# Altium footprint library shkb_lib.PcbLib: 44 footprints (part 3 of 3)
Each footprint in its own frame and in the unit in brackets; x right, y up, seen from the top. Pads: shape width x height; smd on the part's side, far side on the other; paste and mask are expansions set on the pad; w line width, h text height; cw(c..) or ccw(c..) is an arc to the next point about the centre after c.
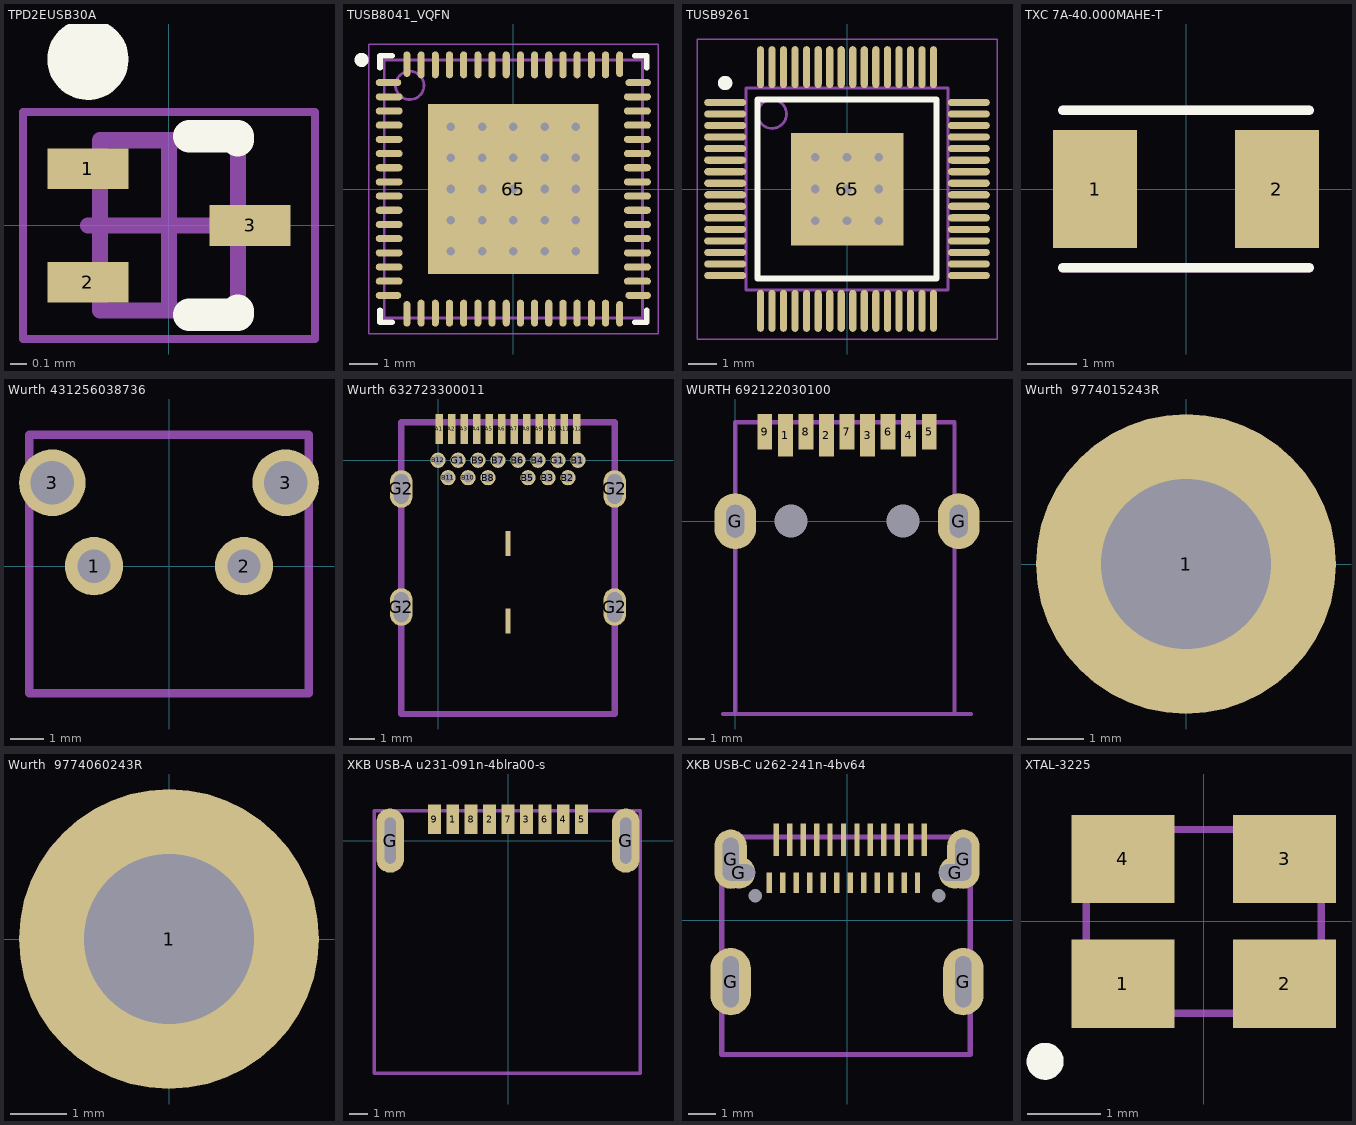
[diagram p2: the footprints below, top view; thin cyan lines are the x and y axes]

## TPD2EUSB30A [mm] "SOTFL, 3-Leads, Body 1.00x1.00mm, Pitch 0.35mm, IPC Medium Density"
height 0.5
pads (3):
  rect 0.5x0.25 smd: 1(-0.5,0.35) 2(-0.5,-0.35) 3(0.5,0)
Top Overlay:
  circle w0.25: c-0.5,1.025 r0.125
  lines w0.2: 0.125,-0.55 0.425,-0.55 0.425,-0.525 ; 0.125,0.55 0.425,0.55 0.425,0.525
Mechanical 13:
  lines w0.1: -0.425,-0.525 0.425,-0.525 0.425,0.525 -0.425,0.525 -0.425,-0.525
  text ".Designator" at -0.1,0.425 h0.2
Mechanical 15:
  lines w0.05: -0.9,-0.7 0.9,-0.7 0.9,0.7 -0.9,0.7 -0.9,-0.7
  lines w0.1: -0.5,0 0.5,0 ; 0,-0.5 0,0.5
3D body: height 0.5, standoff 0, extent -0.425,-0.525 0.425,0.525

## TUSB8041_VQFN [mm]
height 1
pads (65):
  oval 0.9x0.25 smd: 1(-4.4,3.75) 16(-4.4,-3.75) 33(4.4,-3.75) 48(4.4,3.75)
  oval 0.95x0.25 smd: 2(-4.375,3.25) 3(-4.375,2.75) 4(-4.375,2.25) 5(-4.375,1.75) 6(-4.375,1.25) 7(-4.375,0.75) 8(-4.375,0.25) 9(-4.375,-0.25) 10(-4.375,-0.75) 11(-4.375,-1.25) 12(-4.375,-1.75) 13(-4.375,-2.25) 14(-4.375,-2.75) 15(-4.375,-3.25) 34(4.375,-3.25) 35(4.375,-2.75) 36(4.375,-2.25) 37(4.375,-1.75) 38(4.375,-1.25) 39(4.375,-0.75) 40(4.375,-0.25) 41(4.375,0.25) 42(4.375,0.75) 43(4.375,1.25) 44(4.375,1.75) 45(4.375,2.25) 46(4.375,2.75) 47(4.375,3.25)
  oval 0.25x0.9 smd: 17(-3.75,-4.4) 32(3.75,-4.4) 49(3.75,4.4) 64(-3.75,4.4)
  oval 0.25x0.95 smd: 18(-3.25,-4.375) 19(-2.75,-4.375) 20(-2.25,-4.375) 21(-1.75,-4.375) 22(-1.25,-4.375) 23(-0.75,-4.375) 24(-0.25,-4.375) 25(0.25,-4.375) 26(0.75,-4.375) 27(1.25,-4.375) 28(1.75,-4.375) 29(2.25,-4.375) 30(2.75,-4.375) 31(3.25,-4.375) 50(3.25,4.375) 51(2.75,4.375) 52(2.25,4.375) 53(1.75,4.375) 54(1.25,4.375) 55(0.75,4.375) 56(0.25,4.375) 57(-0.25,4.375) 58(-0.75,4.375) 59(-1.25,4.375) 60(-1.75,4.375) 61(-2.25,4.375) 62(-2.75,4.375) 63(-3.25,4.375)
  rect 6x6 smd paste-1000: 65(0,0)
via 2.2,-2.2 diameter 0.508 hole 0.3
via 1.1,-2.2 diameter 0.508 hole 0.3
via 0,-2.2 diameter 0.508 hole 0.3
via -1.1,-2.2 diameter 0.508 hole 0.3
via -2.2,-2.2 diameter 0.508 hole 0.3
via 2.2,-1.1 diameter 0.508 hole 0.3
via 1.1,-1.1 diameter 0.508 hole 0.3
via 0,-1.1 diameter 0.508 hole 0.3
via -1.1,-1.1 diameter 0.508 hole 0.3
via -2.2,-1.1 diameter 0.508 hole 0.3
via 2.2,0 diameter 0.508 hole 0.3
via 1.1,0 diameter 0.508 hole 0.3
via 0,0 diameter 0.508 hole 0.3
via -1.1,0 diameter 0.508 hole 0.3
via -2.2,0 diameter 0.508 hole 0.3
via 2.2,1.1 diameter 0.508 hole 0.3
via 1.1,1.1 diameter 0.508 hole 0.3
via 0,1.1 diameter 0.508 hole 0.3
via -1.1,1.1 diameter 0.508 hole 0.3
via -2.2,1.1 diameter 0.508 hole 0.3
via 2.2,2.2 diameter 0.508 hole 0.3
via 1.1,2.2 diameter 0.508 hole 0.3
via 0,2.2 diameter 0.508 hole 0.3
via -1.1,2.2 diameter 0.508 hole 0.3
via -2.2,2.2 diameter 0.508 hole 0.3
Top Overlay:
  circle w0.25: c-5.35,4.55 r0.125
  lines w0.2: -4.7,-4.275 -4.7,-4.7 -4.275,-4.7 ; -4.7,4.275 -4.7,4.7 -4.275,4.7 ; 4.275,-4.7 4.7,-4.7 4.7,-4.275 ; 4.275,4.7 4.7,4.7 4.7,4.275
Top Paste:
  rectangle: -2.878,-2.878 -1.354,-1.354
  region: 2.878,-2.878 2.878,-1.354 1.354,-1.354 1.354,-2.878
  region: -2.878,2.878 -2.878,1.354 -1.354,1.354 -1.354,2.878
  region: 2.878,2.878 1.354,2.878 1.354,1.354 2.878,1.354
  rectangle: -2.878,-0.838 -1.354,0.846
  region: -0.838,2.878 -0.838,1.354 0.846,1.354 0.846,2.878
  region: 0.838,-2.878 0.838,-1.354 -0.846,-1.354 -0.846,-2.878
  region: 2.878,0.838 1.354,0.838 1.354,-0.846 2.878,-0.846
  region: 0.838,0.838 -0.846,0.838 -0.846,-0.846 0.838,-0.846
Mechanical 13:
  circle w0.1: c-3.65,3.65 r0.5
  lines w0.1: -4.55,-4.55 4.55,-4.55 4.55,4.55 -4.55,4.55 -4.55,-4.55
  text ".Designator" at -1.245,-0.787 h0.5
Mechanical 15:
  lines w0.05: -5.1,-5.1 5.1,-5.1 5.1,5.1 -5.1,5.1 -5.1,-5.1
  lines w0.1: -0.5,0 0.5,0 ; 0,-0.5 0,0.5
3D body "QFN127P600-8N.step": height 1, standoff 0, extent -4.6,-4.6 4.6,4.6

## TUSB9261 [mm]
height 1.2
pads (65):
  oval 1.45x0.25 smd: 1(-4.225,3) 2(-4.225,2.6) 3(-4.225,2.2) 4(-4.225,1.8) 5(-4.225,1.4) 6(-4.225,1) 7(-4.225,0.6) 8(-4.225,0.2) 9(-4.225,-0.2) 10(-4.225,-0.6) 11(-4.225,-1) 12(-4.225,-1.4) 13(-4.225,-1.8) 14(-4.225,-2.2) 15(-4.225,-2.6) 16(-4.225,-3) 33(4.225,-3) 34(4.225,-2.6) 35(4.225,-2.2) 36(4.225,-1.8) 37(4.225,-1.4) 38(4.225,-1) 39(4.225,-0.6) 40(4.225,-0.2) 41(4.225,0.2) 42(4.225,0.6) 43(4.225,1) 44(4.225,1.4) 45(4.225,1.8) 46(4.225,2.2) 47(4.225,2.6) 48(4.225,3)
  oval 0.25x1.45 smd: 17(-3,-4.225) 18(-2.6,-4.225) 19(-2.2,-4.225) 20(-1.8,-4.225) 21(-1.4,-4.225) 22(-1,-4.225) 23(-0.6,-4.225) 24(-0.2,-4.225) 25(0.2,-4.225) 26(0.6,-4.225) 27(1,-4.225) 28(1.4,-4.225) 29(1.8,-4.225) 30(2.2,-4.225) 31(2.6,-4.225) 32(3,-4.225) 49(3,4.225) 50(2.6,4.225) 51(2.2,4.225) 52(1.8,4.225) 53(1.4,4.225) 54(1,4.225) 55(0.6,4.225) 56(0.2,4.225) 57(-0.2,4.225) 58(-0.6,4.225) 59(-1,4.225) 60(-1.4,4.225) 61(-1.8,4.225) 62(-2.2,4.225) 63(-2.6,4.225) 64(-3,4.225)
  rect 3.9x3.9 smd: 65(0,0)
via -1.1,1.1 diameter 0.75 hole 0.3
via 0,1.1 diameter 0.75 hole 0.3
via 1.1,1.1 diameter 0.75 hole 0.3
via -1.1,0 diameter 0.75 hole 0.3
via 0,0 diameter 0.75 hole 0.3
via 1.1,0 diameter 0.75 hole 0.3
via -1.1,-1.1 diameter 0.75 hole 0.3
via 0,-1.1 diameter 0.75 hole 0.3
via 1.1,-1.1 diameter 0.75 hole 0.3
Top Overlay:
  circle w0.25: c-4.225,3.675 r0.125
  lines w0.2: -3.1,-3.1 -3.1,3.1 3.1,3.1 3.1,-3.1 -3.1,-3.1
Mechanical 13:
  circle w0.1: c-2.6,2.6 r0.5
  lines w0.1: -3.5,-3.5 -3.5,3.5 3.5,3.5 3.5,-3.5 -3.5,-3.5
Mechanical 15:
  lines w0.05: -5.2,-5.2 -5.2,5.2 5.2,5.2 5.2,-5.2 -5.2,-5.2
  lines w0.1: -0.5,0 0.5,0 ; 0,-0.5 0,0.5
3D body "TUSB9261.step": height 1.2, standoff 0, extent -4.5,-4.5 4.5,4.5

## TXC 7A-40.000MAHE-T [mm]
pads (2):
  rect 1.7x2.4 smd: 1(-1.85,0) 2(1.85,0)
Top Overlay:
  lines w0.2: -2.5,-1.6 2.5,-1.6 ; -2.5,1.6 2.5,1.6
Mechanical 13:
  lines w0.2: -2.5,-1.6 2.5,-1.6 ; -2.5,1.6 2.5,1.6
3D body: height 1.2, standoff 0, extent -2.591,-1.626 2.565,1.626

## Wurth 431256038736 [mm]
pads (4):
  round 1.75 hole 1: 1(-2.25,0) 2(2.25,0)
  round 2 hole 1.3: 3(-3.5,2.5) 3(3.5,2.5)
Mechanical 13:
  lines w0.254: -4.191,-3.81 4.191,-3.81 4.191,3.937 -4.191,3.937 -4.191,-3.81
  text ".Designator" at 2.286,-1.651 h0.5
3D body "STEP-431256038736-rev1.stp": height 7.2, standoff -3.5, extent -4.2,-3.85 4.2,4

## Wurth 632723300011 [mm]
pads (32):
  rect 0.3x1.2 smd: A1(0.05,1.25) A2(0.55,1.25) A3(1.05,1.25)
  rect 0.3x1.2 smd mask+0.102: A4(1.55,1.25) A5(2.05,1.25) A6(2.55,1.25) A7(3.05,1.25) A8(3.55,1.25) A9(4.05,1.25) A10(4.55,1.25) A11(5.05,1.25) A12(5.55,1.25)
  round 0.61 hole 0.4: B1(5.6,0) B2(5.2,-0.7) B3(4.4,-0.7) B4(4,0) B5(3.6,-0.7) B6(3.2,0) B7(2.4,0) B8(2,-0.7) B9(1.6,0) B10(1.2,-0.7) B11(0.4,-0.7) B12(0,0) G1(0.8,0) G1(4.8,0)
  oval 0.9x1.5 / inner oval 0.9x1.5 / far side oval 1.2x1.7 hole 0.6 slot 1.2 at 90 deg: G2(-1.47,-5.88) G2(7.07,-5.88)
  oval 0.9x1.5 hole 0.6 slot 1.2 at 90 deg: G2(-1.47,-1.15) G2(7.07,-1.15)
  rect 0.2x1 smd mask+0.102: G3(2.8,-6.43) G3(2.8,-3.33)
Mechanical 13:
  lines w0.254: -1.47,-10.16 7.07,-10.16 7.07,1.524 -1.47,1.524 -1.47,-10.16
  text ".Designator" at 0.152,-5.105 h0.5
3D body "STEP-632723300011-rev1.stp": height 3.09, standoff -1.77, extent -1.576,-10.286 7.164,1.508

## WURTH 692122030100 [mm]
height 6.86
pads (13):
  rect 0.9x2.6 smd: 1(3.05,5.22) 2(5.55,5.22) 3(8.05,5.22) 4(10.55,5.22)
  rect 0.9x2.15 smd: 5(11.8,5.445) 6(9.3,5.445) 7(6.8,5.445) 8(4.3,5.445) 9(1.8,5.445)
  oval 2.52x3.4 hole 1.1 slot 2 at 90 deg: G(0,0) G(13.6,0)
  round 0 hole 2 unplated paste-1 mask-1: G(3.4,0) ""(10.2,0)
Mechanical 13:
  lines w0.254: -0.75,-11.735 14.35,-11.735 ; 0,-11.716 0,5.969 ; 0,6.02 13.335,6.02 13.35,6.005 13.35,-11.716
  text ".Designator" at 4.365,-5.391 h0.5
3D body "Download_STP_692122030100 (rev1).stp": height 7.96, standoff -2.28, extent -0.717,-11.72 14.383,6.08

## Wurth  9774015243R [mm]
pads (1):
  round 5.3 hole 3: 1(0,0)
3D body "9774015243R (rev1).stp": height 1.5, standoff -1.4, extent -2.175,-2.172 2.175,2.172

## Wurth  9774060243R [mm]
height 6
pads (1):
  round 5.3 hole 3: 1(0,0)
3D body "9774060243R (rev1).stp": height 5.9, standoff -1.5, extent -2.175,-2.172 2.175,2.172

## XKB USB-A u231-091n-4blra00-s [mm]
pads (11):
  rect 0.7x1.6 smd: 1(-3,1.15) 2(-1,1.15) 3(1,1.15) 4(3,1.15) 5(4,1.15) 6(2,1.15) 7(0,1.15) 8(-2,1.15) 9(-4,1.15)
  oval 1.5x3.5 hole 0.6 slot 2.5 at 90 deg: G(-6.4,0) G(6.4,0)
Mechanical 13:
  lines w0.2: -7.264,-12.649 7.188,-12.649 7.188,1.626 -7.264,1.626 -7.264,-12.649
  text ".Designator" at 2.692,-5.74 h0.5
3D body "u231-091n-4blra00-s.stp": height 7.65, standoff -1.69, extent -7.25,-12.62 7.25,1.6

## XKB USB-C u262-241n-4bv64 [mm]
pads (32):
  rect 0.2x1.2 smd: A1(-2.63,3) A2(-2.13,3) A3(-1.63,3) A4(-1.13,3) A5(-0.63,3) A6(-0.13,3) A7(0.37,3) A8(0.87,3) A9(1.37,3) A10(1.87,3) A11(2.37,3) A12(2.87,3)
  rect 0.2x0.75 smd: B1(2.62,1.4) B2(2.12,1.4) B3(1.62,1.4) B4(1.12,1.4) B5(0.62,1.4) B6(0.12,1.4) B7(-0.38,1.4) B8(-0.88,1.4) B9(-1.38,1.4) B10(-1.88,1.4) B11(-2.38,1.4) B12(-2.88,1.4)
  oval 1.5x2.5 hole 0.6 slot 1.9 at 90 deg: G(-4.32,-2.275) G(4.32,-2.275)
  oval 1.2x2.2 hole 0.6 slot 1.6 at 90 deg: G(-4.32,2.275) G(4.32,2.275)
  round 1.2 hole 0.6 slot 1.2 at 0 deg: G(-4.013,1.778) G(4.013,1.778)
  round 0 hole 0.5 unplated: ""(-3.4,0.925) ""(3.4,0.925)
Mechanical 13:
  lines w0.2: -4.648,-4.978 4.572,-4.978 4.572,3.099 -4.648,3.099 -4.648,-4.978
  text ".Designator" at -3.048,-0.737 h0.5
3D body "u262-241n-4bv64.stp": height 3.35, standoff -0.45, extent -4.63,-4.976 4.63,3.124

## XTAL-3225 [mm]
pads (4):
  rect 1.4x1.2 smd: 1(-1.1,-0.85) 2(1.1,-0.85) 3(1.1,0.85) 4(-1.1,0.85)
Top Overlay:
  circle w0.254: c-2.159,-1.905 r0.125
Mechanical 13:
  lines w0.1: -1.6,-1.25 1.6,-1.25 1.6,1.25 -1.6,1.25 -1.6,-1.25
  text ".Designator" at -1.397,-0.127 h0.35
3D body "3225 SMD Crystal Oscillator.STEP": height 0.65, standoff -0.05, extent -1.6,-1.25 1.6,1.25